# Altium footprint library ic.PcbLib: 98 footprints (part 4 of 7)
Each footprint in its own frame and in the unit in brackets; x right, y up, seen from the top. Pads: shape width x height; smd on the part's side, far side on the other; paste and mask are expansions set on the pad; w line width, h text height; cw(c..) or ccw(c..) is an arc to the next point about the centre after c.
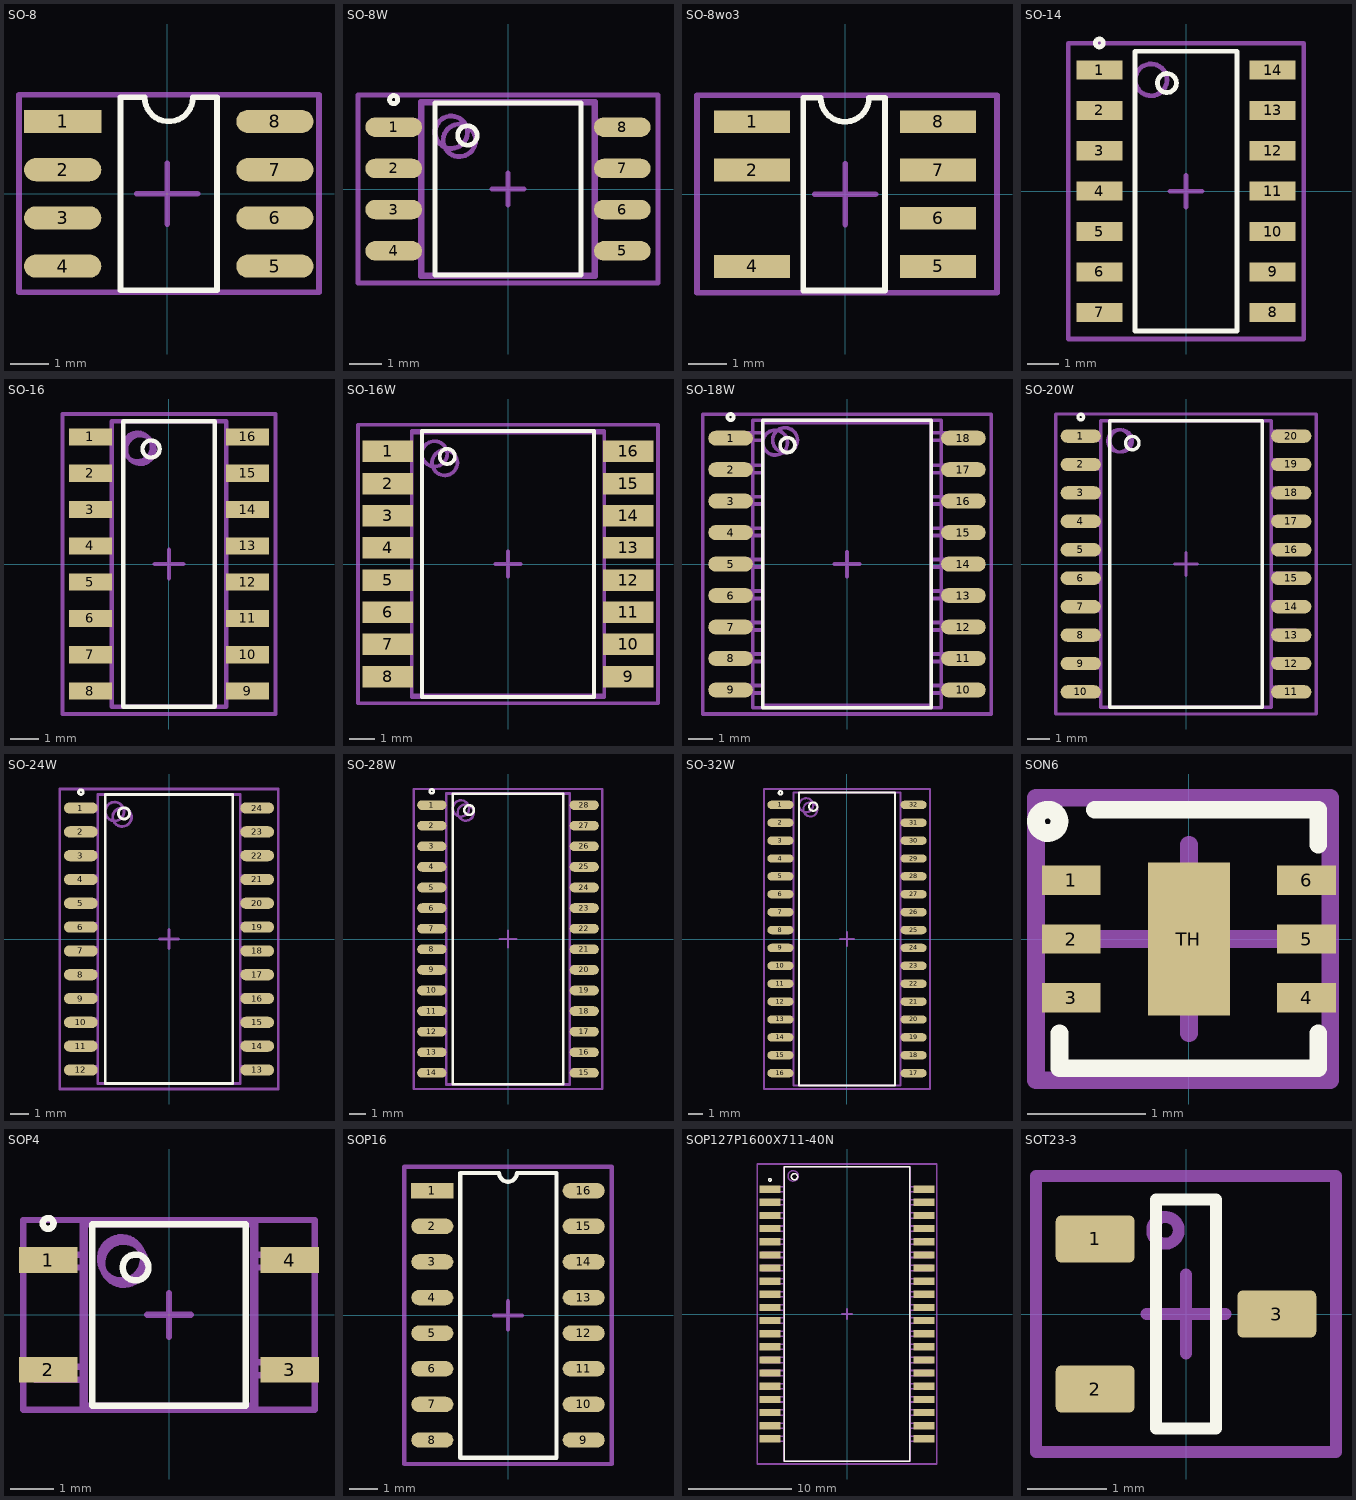
[diagram p3: the footprints below, top view; thin cyan lines are the x and y axes]

## SO-8 [mil]
pads (8):
  rect 80x24 smd: 1(-108.27,74.8)
  oval 80x24 smd: 2(-108.27,24.8) 3(-108.27,-25.2) 4(-108.27,-75.2) 5(111.73,-75.2) 6(111.73,-25.2) 7(111.73,24.8) 8(111.73,74.8)
Top Overlay:
  lines w5.91: -48.27,-100.2 -48.27,99.8 -23.27,99.8 ccw(c1.73,99.8) 26.73,99.8 51.73,99.8 51.73,-100.2 -48.27,-100.2
  text "." at -110.24,102.36 h3.94
Top Courtyard:
  lines w5.91: -31.5,0 0,0 ; 0,-31.5 0,0 ; 0,31.5 0,0 ; 31.5,0 0,0 ; -153.54,-102.36 -153.54,102.36 157.48,102.36 157.48,-102.36 -153.54,-102.36
3D body "User Library-so8-4.STEP": height 69.42, standoff 0, extent -119.06,-96.46 122.54,96.06

## SO-8W [mm] "SOIC, 8-Leads, Body 5,28x5,28mm, Pitch 1,27mm, IPC Medium Density"
height 1.91
pads (8):
  oval 1.75x0.6 smd: 1(-3.525,1.905) 2(-3.525,0.635) 3(-3.525,-0.635) 4(-3.525,-1.905) 5(3.525,-1.905) 6(3.525,-0.635) 7(3.525,0.635) 8(3.525,1.905)
Top Overlay:
  circle w0.15: c-3.525,2.755 r0.125
  circle w0.15: c-1.25,1.65 r0.3
  lines w0.15: -2.25,-2.65 -2.25,2.65 2.25,2.65 2.25,-2.65 -2.25,-2.65
Mechanical 13:
  circle w0.15: c-1.75,1.75 r0.5
  lines w0.15: -2.65,-2.65 -2.65,2.65 2.65,2.65 2.65,-2.65 -2.65,-2.65
Top Courtyard:
  lines w0.15: -0.5,0 0.5,0 ; 0,-0.5 0,0.5 ; -4.625,-2.9 -4.625,2.9 4.625,2.9 4.625,-2.9 -4.625,-2.9
Mechanical 29:
  circle w0.15: c-1.5,1.5 r0.5
  lines w0.15: -2.7,-2.1 -3.8,-2.1 -3.8,-1.8 -2.7,-1.8 ; -2.7,-0.8 -3.8,-0.8 -3.8,-0.5 -2.7,-0.5 ; -2.7,0.5 -3.8,0.5 -3.8,0.8 -2.7,0.8 ; -2.7,1.8 -3.8,1.8 -3.8,2.1 -2.7,2.1 ; 2.7,-2.1 3.8,-2.1 3.8,-1.8 2.7,-1.8 ; 2.7,-0.8 3.8,-0.8 3.8,-0.5 2.7,-0.5 ; 2.7,0.5 3.8,0.5 3.8,0.8 2.7,0.8 ; 2.7,1.8 3.8,1.8 3.8,2.1 2.7,2.1 ; -2.7,-2.7 2.7,-2.7 2.7,2.7 -2.7,2.7 -2.7,-2.7
  text ".Designator" at -2.5,-0.5 h1
3D body: height 1.91, standoff 0.1, extent -2.65,-2.65 2.65,2.65

## SO-8wo3 [mm]
pads (7):
  rect 2x0.6 smd: 1(-2.45,1.905) 2(-2.45,0.635) 4(-2.45,-1.905) 5(2.45,-1.905) 6(2.45,-0.635) 7(2.45,0.635) 8(2.45,1.905)
Top Overlay:
  lines w0.15: -1.1,-2.54 1.05,-2.54 1.05,2.54 0.629,2.54 cw(c-0.006,2.54) -0.641,2.54 -1.1,2.54 -1.1,-2.54
  text "." at -2.5,2.6 h0.1
Top Courtyard:
  lines w0.15: -0.8,0 0,0 ; 0,-0.8 0,0 ; 0,0.8 0,0 ; 0.8,0 0,0 ; -3.9,-2.6 -3.9,2.6 4,2.6 4,-2.6 -3.9,-2.6
3D body "User Library-so8-4.STEP": height 1.76, standoff 0, extent -3.099,-2.445 3.038,2.445

## SO-14 [mm] "SOIC, 14-Leads, Body 8,65x3,90mm, Pitch 1,27mm, IPC Medium Density"
height 1.75
pads (14):
  rect 1.45x0.6 smd: 1(-2.725,3.81) 2(-2.725,2.54) 3(-2.725,1.27) 4(-2.725,0) 5(-2.725,-1.27) 6(-2.725,-2.54) 7(-2.725,-3.81) 8(2.725,-3.81) 9(2.725,-2.54) 10(2.725,-1.27) 11(2.725,0) 12(2.725,1.27) 13(2.725,2.54) 14(2.725,3.81)
Top Overlay:
  circle w0.15: c-2.725,4.66 r0.125
  circle w0.15: c-0.6,3.4 r0.3
  lines w0.15: -1.6,-4.4 -1.6,4.4 1.6,4.4 1.6,-4.4 -1.6,-4.4
Mechanical 13:
  circle w0.15: c-1.1,3.5 r0.5
Top Courtyard:
  lines w0.15: -0.5,0 0.5,0 ; 0,-0.5 0,0.5 ; -3.7,-4.65 -3.7,4.65 3.7,4.65 3.7,-4.65 -3.7,-4.65
3D body "SO-14N.step": height 1.75, standoff 0, extent -3,-4.4 3,4.4

## SO-16 [mm] "SOIC, 16-Leads, Body 9,90x3,90mm, Pitch 1,27mm, IPC Medium Density"
height 1.26
pads (16):
  rect 1.5x0.6 smd: 1(-2.75,4.445) 2(-2.75,3.175) 3(-2.75,1.905) 4(-2.75,0.635) 5(-2.75,-0.635) 6(-2.75,-1.905) 7(-2.75,-3.175) 8(-2.75,-4.445) 9(2.75,-4.445) 10(2.75,-3.175) 11(2.75,-1.905) 12(2.75,-0.635) 13(2.75,0.635) 14(2.75,1.905) 15(2.75,3.175) 16(2.75,4.445)
Top Overlay:
  circle w0.15: c-0.625,4.025 r0.3
  lines w0.15: -1.6,-5 -1.6,5 1.6,5 1.6,-5 -1.6,-5
  text "." at -3.2,5.3 h0.1
Mechanical 13:
  circle w0.15: c-1.1,4.1 r0.5
  lines w0.15: -2,-5 -2,5 2,5 2,-5 -2,-5
Top Courtyard:
  lines w0.15: -0.5,0 0.5,0 ; 0,-0.5 0,0.5 ; -3.725,-5.25 -3.725,5.25 3.725,5.25 3.725,-5.25 -3.725,-5.25
Mechanical 29:
  circle w0.15: c-1,4 r0.5
  lines w0.15: -2,-4.6 -3.1,-4.6 -3.1,-4.3 -2,-4.3 ; -2,-3.33 -3.1,-3.33 -3.1,-3.03 -2,-3.03 ; -2,-2.06 -3.1,-2.06 -3.1,-1.76 -2,-1.76 ; -2,-0.79 -3.1,-0.79 -3.1,-0.49 -2,-0.49 ; -2,0.48 -3.1,0.48 -3.1,0.78 -2,0.78 ; -2,1.75 -3.1,1.75 -3.1,2.05 -2,2.05 ; -2,3.02 -3.1,3.02 -3.1,3.32 -2,3.32 ; -2,4.29 -3.1,4.29 -3.1,4.59 -2,4.59 ; 2,-4.6 3.1,-4.6 3.1,-4.3 2,-4.3 ; 2,-3.33 3.1,-3.33 3.1,-3.03 2,-3.03 ; 2,-2.06 3.1,-2.06 3.1,-1.76 2,-1.76 ; 2,-0.79 3.1,-0.79 3.1,-0.49 2,-0.49 ; 2,0.48 3.1,0.48 3.1,0.78 2,0.78 ; 2,1.75 3.1,1.75 3.1,2.05 2,2.05 ; 2,3.02 3.1,3.02 3.1,3.32 2,3.32 ; 2,4.29 3.1,4.29 3.1,4.59 2,4.59 ; -2,-5 -2,5 2,5 2,-5 -2,-5
  text ".Designator" at -1.9,-0.3 h1
3D body "SO-16.step": height 1.75, standoff 0, extent -3,-5 3,5

## SO-16W [mm] "SOIC, 16-Leads, Body 10,30x7,50mm, Pitch 1,27mm, IPC Medium Density"
height 2.65
pads (16):
  rect 2x0.85 smd: 1(-4.75,4.445) 2(-4.75,3.175) 3(-4.75,1.905) 4(-4.75,0.635) 5(-4.75,-0.635) 6(-4.75,-1.905) 7(-4.75,-3.175) 8(-4.75,-4.445) 9(4.75,-4.445) 10(4.75,-3.175) 11(4.75,-1.905) 12(4.75,-0.635) 13(4.75,0.635) 14(4.75,1.905) 15(4.75,3.175) 16(4.75,4.445)
Top Overlay:
  circle w0.15: c-2.4,4.25 r0.3
  lines w0.15: -3.4,-5.25 -3.4,5.25 3.4,5.25 3.4,-5.25 -3.4,-5.25
  text "." at -5.5,5.4 h0.1
Mechanical 13:
  circle w0.15: c-2.9,4.35 r0.5
  lines w0.15: -3.8,-5.25 -3.8,5.25 3.8,5.25 3.8,-5.25 -3.8,-5.25
Top Courtyard:
  lines w0.15: -0.5,0 0.5,0 ; 0,-0.5 0,0.5 ; -5.925,-5.5 -5.925,5.5 5.925,5.5 5.925,-5.5 -5.925,-5.5
Mechanical 29:
  circle w0.15: c-2.5,4 r0.5
  lines w0.15: -3.8,-4.7 -4.9,-4.7 -4.9,-4.4 -3.8,-4.4 ; -3.8,-3.43 -4.9,-3.43 -4.9,-3.13 -3.8,-3.13 ; -3.8,-2.16 -4.9,-2.16 -4.9,-1.86 -3.8,-1.86 ; -3.8,-0.89 -4.9,-0.89 -4.9,-0.59 -3.8,-0.59 ; -3.8,0.38 -4.9,0.38 -4.9,0.68 -3.8,0.68 ; -3.8,1.65 -4.9,1.65 -4.9,1.95 -3.8,1.95 ; -3.8,2.92 -4.9,2.92 -4.9,3.22 -3.8,3.22 ; -3.8,4.19 -4.9,4.19 -4.9,4.49 -3.8,4.49 ; 3.8,-4.7 4.9,-4.7 4.9,-4.4 3.8,-4.4 ; 3.8,-3.43 4.9,-3.43 4.9,-3.13 3.8,-3.13 ; 3.8,-2.16 4.9,-2.16 4.9,-1.86 3.8,-1.86 ; 3.8,-0.89 4.9,-0.89 4.9,-0.59 3.8,-0.59 ; 3.8,0.38 4.9,0.38 4.9,0.68 3.8,0.68 ; 3.8,1.65 4.9,1.65 4.9,1.95 3.8,1.95 ; 3.8,2.92 4.9,2.92 4.9,3.22 3.8,3.22 ; 3.8,4.19 4.9,4.19 4.9,4.49 3.8,4.49 ; -3.8,-5.2 3.8,-5.2 3.8,5.2 -3.8,5.2 -3.8,-5.2
  text ".Designator" at -3.3,-0.3 h1
3D body "SOIC16W.step": height 2.65, standoff 0, extent -5.162,-5.25 5.163,5.25

## SO-18W [mm] "JEDEC MS-013"
height 2.57
pads (18):
  oval 1.8x0.6 smd: 1(-4.7,5.08) 2(-4.7,3.81) 3(-4.7,2.54) 4(-4.7,1.27) 5(-4.7,0) 6(-4.7,-1.27) 7(-4.7,-2.54) 8(-4.7,-3.81) 9(-4.7,-5.08) 10(4.7,-5.08) 11(4.7,-3.81) 12(4.7,-2.54) 13(4.7,-1.27) 14(4.7,0) 15(4.7,1.27) 16(4.7,2.54) 17(4.7,3.81) 18(4.7,5.08)
Top Overlay:
  circle w0.15: c-4.7,5.93 r0.125
  circle w0.15: c-2.4,4.8 r0.3
  lines w0.15: -3.4,-5.8 -3.4,5.8 3.4,5.8 3.4,-5.8 -3.4,-5.8
Mechanical 13:
  circle w0.15: c-2.9,4.9 r0.5
  lines w0.15: -3.8,-5.8 -3.8,5.8 3.8,5.8 3.8,-5.8 -3.8,-5.8
Top Courtyard:
  lines w0.15: -0.5,0 0.5,0 ; 0,-0.5 0,0.5 ; -5.825,-6.05 -5.825,6.05 5.825,6.05 5.825,-6.05 -5.825,-6.05
Mechanical 29:
  circle w0.15: c-2.5,5 r0.5
  lines w0.15: -3.4,-5.2 -4.5,-5.2 -4.5,-4.9 -3.4,-4.9 ; -3.4,-3.93 -4.5,-3.93 -4.5,-3.63 -3.4,-3.63 ; -3.4,-2.66 -4.5,-2.66 -4.5,-2.36 -3.4,-2.36 ; -3.4,-1.39 -4.5,-1.39 -4.5,-1.09 -3.4,-1.09 ; -3.4,-0.12 -4.5,-0.12 -4.5,0.18 -3.4,0.18 ; -3.4,1.15 -4.5,1.15 -4.5,1.45 -3.4,1.45 ; -3.4,2.42 -4.5,2.42 -4.5,2.72 -3.4,2.72 ; -3.4,3.69 -4.5,3.69 -4.5,3.99 -3.4,3.99 ; -3.4,5 -4.5,5 -4.5,5.3 -3.4,5.3 ; 3.4,-5.2 4.5,-5.2 4.5,-4.9 3.4,-4.9 ; 3.4,-3.93 4.5,-3.93 4.5,-3.63 3.4,-3.63 ; 3.4,-2.66 4.5,-2.66 4.5,-2.36 3.4,-2.36 ; 3.4,-1.39 4.5,-1.39 4.5,-1.09 3.4,-1.09 ; 3.4,-0.12 4.5,-0.12 4.5,0.18 3.4,0.18 ; 3.4,1.15 4.5,1.15 4.5,1.45 3.4,1.45 ; 3.4,2.42 4.5,2.42 4.5,2.72 3.4,2.72 ; 3.4,3.69 4.5,3.69 4.5,3.99 3.4,3.99 ; 3.4,5 4.5,5 4.5,5.3 3.4,5.3 ; -3.4,-5.7 -3.4,5.7 3.4,5.7 3.4,-5.7 -3.4,-5.7
  text ".Designator" at -3.1,-0.4 h1
3D body: height 2.57, standoff 0.23, extent -3.8,-5.8 3.8,5.8

## SO-20W [mm] "JEDEC MS-013"
height 2.57
pads (20):
  oval 1.8x0.6 smd: 1(-4.7,5.715) 2(-4.7,4.445) 3(-4.7,3.175) 4(-4.7,1.905) 5(-4.7,0.635) 6(-4.7,-0.635) 7(-4.7,-1.905) 8(-4.7,-3.175) 9(-4.7,-4.445) 10(-4.7,-5.715) 11(4.7,-5.715) 12(4.7,-4.445) 13(4.7,-3.175) 14(4.7,-1.905) 15(4.7,-0.635) 16(4.7,0.635) 17(4.7,1.905) 18(4.7,3.175) 19(4.7,4.445) 20(4.7,5.715)
Top Overlay:
  circle w0.15: c-4.7,6.565 r0.125
  circle w0.15: c-2.4,5.4 r0.3
  lines w0.15: -3.4,-6.4 -3.4,6.4 3.4,6.4 3.4,-6.4 -3.4,-6.4
Mechanical 13:
  circle w0.15: c-2.9,5.5 r0.5
  lines w0.15: -3.8,-6.4 -3.8,6.4 3.8,6.4 3.8,-6.4 -3.8,-6.4
Top Courtyard:
  lines w0.15: -0.5,0 0.5,0 ; 0,-0.5 0,0.5 ; -5.825,-6.7 -5.825,6.7 5.825,6.7 5.825,-6.7 -5.825,-6.7
Mechanical 29:
  circle w0.15: c-3,5.5 r0.5
  lines w0.15: -3.8,-5.9 -4.9,-5.9 -4.9,-5.6 -3.8,-5.6 ; -3.8,-4.63 -4.9,-4.63 -4.9,-4.33 -3.8,-4.33 ; -3.8,-3.36 -4.9,-3.36 -4.9,-3.06 -3.8,-3.06 ; -3.8,-2.09 -4.9,-2.09 -4.9,-1.79 -3.8,-1.79 ; -3.8,-0.82 -4.9,-0.82 -4.9,-0.52 -3.8,-0.52 ; -3.8,0.45 -4.9,0.45 -4.9,0.75 -3.8,0.75 ; -3.8,1.72 -4.9,1.72 -4.9,2.02 -3.8,2.02 ; -3.8,2.99 -4.9,2.99 -4.9,3.29 -3.8,3.29 ; -3.8,4.26 -4.9,4.26 -4.9,4.56 -3.8,4.56 ; -3.8,5.53 -4.9,5.53 -4.9,5.83 -3.8,5.83 ; 3.8,-5.8 4.9,-5.8 4.9,-5.5 3.8,-5.5 ; 3.8,-4.53 4.9,-4.53 4.9,-4.23 3.8,-4.23 ; 3.8,-3.26 4.9,-3.26 4.9,-2.96 3.8,-2.96 ; 3.8,-1.99 4.9,-1.99 4.9,-1.69 3.8,-1.69 ; 3.8,-0.72 4.9,-0.72 4.9,-0.42 3.8,-0.42 ; 3.8,0.55 4.9,0.55 4.9,0.85 3.8,0.85 ; 3.8,1.82 4.9,1.82 4.9,2.12 3.8,2.12 ; 3.8,3.09 4.9,3.09 4.9,3.39 3.8,3.39 ; 3.8,4.36 4.9,4.36 4.9,4.66 3.8,4.66 ; 3.8,5.63 4.9,5.63 4.9,5.93 3.8,5.93 ; -3.8,-6.4 -3.8,6.4 3.8,6.4 3.8,-6.4 -3.8,-6.4
  text ".Designator" at -3.1,-0.3 h1
3D body: height 2.57, standoff 0.23, extent -3.8,-6.4 3.8,6.4

## SO-24W [mm] "JEDEC MS-013"
height 2.57
pads (24):
  oval 1.8x0.6 smd: 1(-4.7,6.985) 2(-4.7,5.715) 3(-4.7,4.445) 4(-4.7,3.175) 5(-4.7,1.905) 6(-4.7,0.635) 7(-4.7,-0.635) 8(-4.7,-1.905) 9(-4.7,-3.175) 10(-4.7,-4.445) 11(-4.7,-5.715) 12(-4.7,-6.985) 13(4.7,-6.985) 14(4.7,-5.715) 15(4.7,-4.445) 16(4.7,-3.175) 17(4.7,-1.905) 18(4.7,-0.635) 19(4.7,0.635) 20(4.7,1.905) 21(4.7,3.175) 22(4.7,4.445) 23(4.7,5.715) 24(4.7,6.985)
Top Overlay:
  circle w0.15: c-4.7,7.835 r0.125
  circle w0.15: c-2.4,6.7 r0.3
  lines w0.15: -3.4,-7.7 -3.4,7.7 3.4,7.7 3.4,-7.7 -3.4,-7.7
Mechanical 13:
  circle w0.15: c-2.9,6.8 r0.5
  lines w0.15: -3.8,-7.7 -3.8,7.7 3.8,7.7 3.8,-7.7 -3.8,-7.7
Top Courtyard:
  lines w0.15: -0.5,0 0.5,0 ; 0,-0.5 0,0.5 ; -5.825,-8 -5.825,8 5.825,8 5.825,-8 -5.825,-8
Mechanical 29:
  circle w0.15: c-2.5,6.5 r0.5
  lines w0.15: -3.8,-7.1 -4.9,-7.1 -4.9,-6.8 -3.8,-6.8 ; -3.8,-5.83 -4.9,-5.83 -4.9,-5.53 -3.8,-5.53 ; -3.8,-4.56 -4.9,-4.56 -4.9,-4.26 -3.8,-4.26 ; -3.8,-3.29 -4.9,-3.29 -4.9,-2.99 -3.8,-2.99 ; -3.8,-2.02 -4.9,-2.02 -4.9,-1.72 -3.8,-1.72 ; -3.8,-0.75 -4.9,-0.75 -4.9,-0.45 -3.8,-0.45 ; -3.8,0.52 -4.9,0.52 -4.9,0.82 -3.8,0.82 ; -3.8,1.79 -4.9,1.79 -4.9,2.09 -3.8,2.09 ; -3.8,3.06 -4.9,3.06 -4.9,3.36 -3.8,3.36 ; -3.8,4.33 -4.9,4.33 -4.9,4.63 -3.8,4.63 ; -3.8,5.56 -4.9,5.56 -4.9,5.86 -3.8,5.86 ; -3.8,6.83 -4.9,6.83 -4.9,7.13 -3.8,7.13 ; 3.8,-7.1 4.9,-7.1 4.9,-6.8 3.8,-6.8 ; 3.8,-5.83 4.9,-5.83 4.9,-5.53 3.8,-5.53 ; 3.8,-4.56 4.9,-4.56 4.9,-4.26 3.8,-4.26 ; 3.8,-3.29 4.9,-3.29 4.9,-2.99 3.8,-2.99 ; 3.8,-2.02 4.9,-2.02 4.9,-1.72 3.8,-1.72 ; 3.8,-0.75 4.9,-0.75 4.9,-0.45 3.8,-0.45 ; 3.8,0.52 4.9,0.52 4.9,0.82 3.8,0.82 ; 3.8,1.79 4.9,1.79 4.9,2.09 3.8,2.09 ; 3.8,3.06 4.9,3.06 4.9,3.36 3.8,3.36 ; 3.8,4.33 4.9,4.33 4.9,4.63 3.8,4.63 ; 3.8,5.56 4.9,5.56 4.9,5.86 3.8,5.86 ; 3.8,6.83 4.9,6.83 4.9,7.13 3.8,7.13 ; -3.8,-7.7 -3.8,7.7 3.8,7.7 3.8,-7.7 -3.8,-7.7
  text ".Designator" at -2.7,-0.4 h1
3D body: height 2.57, standoff 0.23, extent -3.8,-7.7 3.8,7.7

## SO-28W [mm] "JEDEC MS-013"
height 2.57
pads (28):
  oval 1.8x0.6 smd: 1(-4.7,8.255) 2(-4.7,6.985) 3(-4.7,5.715) 4(-4.7,4.445) 5(-4.7,3.175) 6(-4.7,1.905) 7(-4.7,0.635) 8(-4.7,-0.635) 9(-4.7,-1.905) 10(-4.7,-3.175) 11(-4.7,-4.445) 12(-4.7,-5.715) 13(-4.7,-6.985) 14(-4.7,-8.255) 15(4.7,-8.255) 16(4.7,-6.985) 17(4.7,-5.715) 18(4.7,-4.445) 19(4.7,-3.175) 20(4.7,-1.905) 21(4.7,-0.635) 22(4.7,0.635) 23(4.7,1.905) 24(4.7,3.175) 25(4.7,4.445) 26(4.7,5.715) 27(4.7,6.985) 28(4.7,8.255)
Top Overlay:
  circle w0.15: c-2.4,7.95 r0.3
  circle w0.15: c-4.7,9.105 r0.125
  lines w0.15: -3.4,-8.95 3.4,-8.95 3.4,8.95 -3.4,8.95 -3.4,-8.95
Mechanical 13:
  circle w0.15: c-2.9,8.05 r0.5
  lines w0.15: -3.8,-8.95 3.8,-8.95 3.8,8.95 -3.8,8.95 -3.8,-8.95
Top Courtyard:
  lines w0.15: -0.5,0 0.5,0 ; 0,-0.5 0,0.5 ; -5.825,-9.25 5.825,-9.25 5.825,9.25 -5.825,9.25 -5.825,-9.25
Mechanical 29:
  circle w0.15: c-2.6,7.8 r0.5
  lines w0.15: -3.8,-8.37 -4.9,-8.37 -4.9,-8.07 -3.8,-8.07 ; -3.8,-7.1 -4.9,-7.1 -4.9,-6.8 -3.8,-6.8 ; -3.8,-5.83 -4.9,-5.83 -4.9,-5.53 -3.8,-5.53 ; -3.8,-4.56 -4.9,-4.56 -4.9,-4.26 -3.8,-4.26 ; -3.8,-3.29 -4.9,-3.29 -4.9,-2.99 -3.8,-2.99 ; -3.8,-2.02 -4.9,-2.02 -4.9,-1.72 -3.8,-1.72 ; -3.8,-0.75 -4.9,-0.75 -4.9,-0.45 -3.8,-0.45 ; -3.8,0.52 -4.9,0.52 -4.9,0.82 -3.8,0.82 ; -3.8,1.79 -4.9,1.79 -4.9,2.09 -3.8,2.09 ; -3.8,3.06 -4.9,3.06 -4.9,3.36 -3.8,3.36 ; -3.8,4.33 -4.9,4.33 -4.9,4.63 -3.8,4.63 ; -3.8,5.56 -4.9,5.56 -4.9,5.86 -3.8,5.86 ; -3.8,6.83 -4.9,6.83 -4.9,7.13 -3.8,7.13 ; -3.8,8.1 -4.9,8.1 -4.9,8.4 -3.8,8.4 ; 3.8,-8.37 4.9,-8.37 4.9,-8.07 3.8,-8.07 ; 3.8,-7.1 4.9,-7.1 4.9,-6.8 3.8,-6.8 ; 3.8,-5.83 4.9,-5.83 4.9,-5.53 3.8,-5.53 ; 3.8,-4.56 4.9,-4.56 4.9,-4.26 3.8,-4.26 ; 3.8,-3.29 4.9,-3.29 4.9,-2.99 3.8,-2.99 ; 3.8,-2.02 4.9,-2.02 4.9,-1.72 3.8,-1.72 ; 3.8,-0.75 4.9,-0.75 4.9,-0.45 3.8,-0.45 ; 3.8,0.52 4.9,0.52 4.9,0.82 3.8,0.82 ; 3.8,1.79 4.9,1.79 4.9,2.09 3.8,2.09 ; 3.8,3.06 4.9,3.06 4.9,3.36 3.8,3.36 ; 3.8,4.33 4.9,4.33 4.9,4.63 3.8,4.63 ; 3.8,5.56 4.9,5.56 4.9,5.86 3.8,5.86 ; 3.8,6.83 4.9,6.83 4.9,7.13 3.8,7.13 ; 3.8,8.1 4.9,8.1 4.9,8.4 3.8,8.4 ; -3.8,-9 -3.8,9 3.8,9 3.8,-9 -3.8,-9
  text ".Designator" at -3.3,-0.4 h1
3D body: height 2.57, standoff 0.23, extent -3.8,-8.95 3.8,8.95

## SO-32W [mm] "JEDEC MO-119"
height 2.41
pads (32):
  oval 1.85x0.6 smd: 1(-4.725,9.525) 2(-4.725,8.255) 3(-4.725,6.985) 4(-4.725,5.715) 5(-4.725,4.445) 6(-4.725,3.175) 7(-4.725,1.905) 8(-4.725,0.635) 9(-4.725,-0.635) 10(-4.725,-1.905) 11(-4.725,-3.175) 12(-4.725,-4.445) 13(-4.725,-5.715) 14(-4.725,-6.985) 15(-4.725,-8.255) 16(-4.725,-9.525) 17(4.725,-9.525) 18(4.725,-8.255) 19(4.725,-6.985) 20(4.725,-5.715) 21(4.725,-4.445) 22(4.725,-3.175) 23(4.725,-1.905) 24(4.725,-0.635) 25(4.725,0.635) 26(4.725,1.905) 27(4.725,3.175) 28(4.725,4.445) 29(4.725,5.715) 30(4.725,6.985) 31(4.725,8.255) 32(4.725,9.525)
Top Overlay:
  circle w0.15: c-2.4,9.4 r0.3
  circle w0.15: c-4.725,10.375 r0.125
  lines w0.15: -3.4,-10.4 3.4,-10.4 3.4,10.4 -3.4,10.4 -3.4,-10.4
Mechanical 13:
  circle w0.15: c-2.9,9.5 r0.5
  lines w0.15: -3.8,-10.4 3.8,-10.4 3.8,10.4 -3.8,10.4 -3.8,-10.4
Top Courtyard:
  lines w0.15: -0.5,0 0.5,0 ; 0,-0.5 0,0.5 ; -5.9,-10.65 5.9,-10.65 5.9,10.65 -5.9,10.65 -5.9,-10.65
Mechanical 29:
  circle w0.15: c-2.6,9.2 r0.5
  lines w0.15: -3.8,-9.7 -4.9,-9.7 -4.9,-9.4 -3.8,-9.4 ; -3.8,-8.37 -4.9,-8.37 -4.9,-8.07 -3.8,-8.07 ; -3.8,-7.1 -4.9,-7.1 -4.9,-6.8 -3.8,-6.8 ; -3.8,-5.83 -4.9,-5.83 -4.9,-5.53 -3.8,-5.53 ; -3.8,-4.56 -4.9,-4.56 -4.9,-4.26 -3.8,-4.26 ; -3.8,-3.29 -4.9,-3.29 -4.9,-2.99 -3.8,-2.99 ; -3.8,-2.02 -4.9,-2.02 -4.9,-1.72 -3.8,-1.72 ; -3.8,-0.75 -4.9,-0.75 -4.9,-0.45 -3.8,-0.45 ; -3.8,0.52 -4.9,0.52 -4.9,0.82 -3.8,0.82 ; -3.8,1.79 -4.9,1.79 -4.9,2.09 -3.8,2.09 ; -3.8,3.06 -4.9,3.06 -4.9,3.36 -3.8,3.36 ; -3.8,4.33 -4.9,4.33 -4.9,4.63 -3.8,4.63 ; -3.8,5.56 -4.9,5.56 -4.9,5.86 -3.8,5.86 ; -3.8,6.83 -4.9,6.83 -4.9,7.13 -3.8,7.13 ; -3.8,8.1 -4.9,8.1 -4.9,8.4 -3.8,8.4 ; -3.8,9.4 -4.9,9.4 -4.9,9.7 -3.8,9.7 ; 3.8,-9.7 4.9,-9.7 4.9,-9.4 3.8,-9.4 ; 3.8,-8.37 4.9,-8.37 4.9,-8.07 3.8,-8.07 ; 3.8,-7.1 4.9,-7.1 4.9,-6.8 3.8,-6.8 ; 3.8,-5.83 4.9,-5.83 4.9,-5.53 3.8,-5.53 ; 3.8,-4.56 4.9,-4.56 4.9,-4.26 3.8,-4.26 ; 3.8,-3.29 4.9,-3.29 4.9,-2.99 3.8,-2.99 ; 3.8,-2.02 4.9,-2.02 4.9,-1.72 3.8,-1.72 ; 3.8,-0.75 4.9,-0.75 4.9,-0.45 3.8,-0.45 ; 3.8,0.52 4.9,0.52 4.9,0.82 3.8,0.82 ; 3.8,1.79 4.9,1.79 4.9,2.09 3.8,2.09 ; 3.8,3.06 4.9,3.06 4.9,3.36 3.8,3.36 ; 3.8,4.33 4.9,4.33 4.9,4.63 3.8,4.63 ; 3.8,5.56 4.9,5.56 4.9,5.86 3.8,5.86 ; 3.8,6.83 4.9,6.83 4.9,7.13 3.8,7.13 ; 3.8,8.1 4.9,8.1 4.9,8.4 3.8,8.4 ; 3.8,9.4 4.9,9.4 4.9,9.7 3.8,9.7 ; -3.8,-10.4 3.8,-10.4 3.8,10.4 -3.8,10.4 -3.8,-10.4
  text ".Designator" at -3.1,-0.4 h1
3D body: height 2.41, standoff 0.18, extent -3.8,-10.4 3.8,10.4

## SON6 [mm]
height 1
pads (7):
  rect 0.5x0.25 smd: 1(-1,0.5) 2(-1,0) 3(-1,-0.5) 4(1,-0.5) 5(1,0) 6(1,0.5)
  rect 0.7x1.3 smd: TH(0,0)
Top Overlay:
  circle w0.15: c-1.2,1 r0.1
  lines w0.15: -1.1,-0.8 -1.1,-1.1 1.1,-1.1 1.1,-0.8 ; -0.8,1.1 1.1,1.1 1.1,0.8
Top Courtyard:
  lines w0.15: -0.8,0 0,0 ; 0,-0.8 0,0 ; 0,0.8 0,0 ; 0.8,0 0,0 ; -1.3,-1.2 1.2,-1.2 1.2,1.2 -1.3,1.2 -1.3,-1.2
3D body: height 0.8, standoff 0, extent -1,-1 1,1

## SOP4 [mm] "SOP, 4-Leads, Body 4,00x3,79mm, Pitch 2,54mm, IPC High Density"
height 2.19
pads (4):
  rect 1.35x0.6 smd: 1(-2.8,1.27) 2(-2.8,-1.27) 3(2.8,-1.27) 4(2.8,1.27)
Top Overlay:
  circle w0.15: c-0.775,1.1 r0.3
  circle w0.15: c-2.8,2.12 r0.125
  lines w0.15: -1.775,-2.1 1.775,-2.1 1.775,2.1 -1.775,2.1 -1.775,-2.1
Mechanical 13:
  circle w0.15: c-1.05,1.2 r0.5
  lines w0.15: -1.95,-2.1 1.95,-2.1 1.95,2.1 -1.95,2.1 -1.95,-2.1
Top Courtyard:
  lines w0.15: -0.5,0 0.5,0 ; 0,-0.5 0,0.5 ; -3.375,-2.2 3.375,-2.2 3.375,2.2 -3.375,2.2 -3.375,-2.2
Mechanical 29:
  circle w0.15: c-1.1,1.3 r0.5
  lines w0.15: -2,-1.5 -3.1,-1.5 -3.1,-1.2 -2,-1.2 ; -2,1.1 -3.1,1.1 -3.1,1.4 -2,1.4 ; 2,-1.4 3.1,-1.4 3.1,-1.1 2,-1.1 ; 2,1.1 3.1,1.1 3.1,1.4 2,1.4 ; -2,-2.2 2,-2.2 2,2.2 -2,2.2 -2,-2.2
  text ".Designator" at -1.8,-0.5 h1
3D body "SOP4.step": height 2.18, standoff 0, extent -3.025,-2.1 3.025,2.1

## SOP16 [mm]
pads (16):
  rect 1.5x0.55 smd: 1(-2.7,4.445)
  oval 1.5x0.55 smd: 2(-2.7,3.175) 3(-2.7,1.905) 4(-2.7,0.635) 5(-2.7,-0.635) 6(-2.7,-1.905) 7(-2.7,-3.175) 8(-2.7,-4.445) 9(2.7,-4.445) 10(2.7,-3.175) 11(2.7,-1.905) 12(2.7,-0.635) 13(2.7,0.635) 14(2.7,1.905) 15(2.7,3.175) 16(2.7,4.445)
Top Overlay:
  lines w0.15: -1.7,-5.08 1.725,-5.08 1.725,5.08 0.318,5.08 cw(c0,5.08) -0.318,5.08 -1.7,5.08 -1.7,-5.08
  text "." at -2.7,5.145 h0.1
Top Courtyard:
  lines w0.15: -0.5,0 0.5,0 ; 0,-0.5 0,0.5 ; -3.7,-5.3 3.7,-5.3 3.7,5.3 -3.7,5.3 -3.7,-5.3
3D body "SOIC16.STEP": height 1.75, standoff 0, extent -3.1,-4.955 3.1,4.945

## SOP127P1600X711-40N [mm] "SOP, 40-Leads, Body 28,50x12,19mm, Pitch 1,27mm, IPC Medium Density"
height 7.11
pads (40):
  rect 2x0.7 smd: 1(-7.45,12.065) 2(-7.45,10.795) 3(-7.45,9.525) 4(-7.45,8.255) 5(-7.45,6.985) 6(-7.45,5.715) 7(-7.45,4.445) 8(-7.45,3.175) 9(-7.45,1.905) 10(-7.45,0.635) 11(-7.45,-0.635) 12(-7.45,-1.905) 13(-7.45,-3.175) 14(-7.45,-4.445) 15(-7.45,-5.715) 16(-7.45,-6.985) 17(-7.45,-8.255) 18(-7.45,-9.525) 19(-7.45,-10.795) 20(-7.45,-12.065) 21(7.45,-12.065) 22(7.45,-10.795) 23(7.45,-9.525) 24(7.45,-8.255) 25(7.45,-6.985) 26(7.45,-5.715) 27(7.45,-4.445) 28(7.45,-3.175) 29(7.45,-1.905) 30(7.45,-0.635) 31(7.45,0.635) 32(7.45,1.905) 33(7.45,3.175) 34(7.45,4.445) 35(7.45,5.715) 36(7.45,6.985) 37(7.45,8.255) 38(7.45,9.525) 39(7.45,10.795) 40(7.45,12.065)
Top Overlay:
  circle w0.15: c-7.45,12.965 r0.125
  circle w0.15: c-5.075,13.275 r0.3
  lines w0.15: -6.05,-14.25 -6.05,14.25 6.05,14.25 6.05,-14.25 -6.05,-14.25
Top Courtyard:
  lines w0.15: -0.5,0 0.5,0 ; 0,-0.5 0,0.5 ; -8.675,-14.5 -8.675,14.5 8.675,14.5 8.675,-14.5 -8.675,-14.5
Mechanical 29:
  circle w0.15: c-5.2,13.35 r0.5
  lines w0.15: -6.096,-12.319 -8.255,-12.319 -8.255,-11.811 -6.096,-11.811 ; -6.096,-11.049 -8.255,-11.049 -8.255,-10.541 -6.096,-10.541 ; -6.096,-9.779 -8.255,-9.779 -8.255,-9.271 -6.096,-9.271 ; -6.096,-8.509 -8.255,-8.509 -8.255,-8.001 -6.096,-8.001 ; -6.096,-7.239 -8.255,-7.239 -8.255,-6.731 -6.096,-6.731 ; -6.096,-5.969 -8.255,-5.969 -8.255,-5.461 -6.096,-5.461 ; -6.096,-4.699 -8.255,-4.699 -8.255,-4.191 -6.096,-4.191 ; -6.096,-3.429 -8.255,-3.429 -8.255,-2.921 -6.096,-2.921 ; -6.096,-2.159 -8.255,-2.159 -8.255,-1.651 -6.096,-1.651 ; -6.096,-0.889 -8.255,-0.889 -8.255,-0.381 -6.096,-0.381 ; -6.096,0.381 -8.255,0.381 -8.255,0.889 -6.096,0.889 ; -6.096,1.651 -8.255,1.651 -8.255,2.159 -6.096,2.159 ; -6.096,2.921 -8.255,2.921 -8.255,3.429 -6.096,3.429 ; -6.096,4.191 -8.255,4.191 -8.255,4.699 -6.096,4.699 ; -6.096,5.461 -8.255,5.461 -8.255,5.969 -6.096,5.969 ; -6.096,6.731 -8.255,6.731 -8.255,7.239 -6.096,7.239 ; -6.096,8.001 -8.255,8.001 -8.255,8.509 -6.096,8.509 ; -6.096,9.271 -8.255,9.271 -8.255,9.779 -6.096,9.779 ; -6.096,10.541 -8.255,10.541 -8.255,11.049 -6.096,11.049 ; -6.096,11.811 -8.255,11.811 -8.255,12.319 -6.096,12.319 ; 6.096,-12.319 8.255,-12.319 8.255,-11.811 6.096,-11.811 ; 6.096,-11.049 8.255,-11.049 8.255,-10.541 6.096,-10.541 ; 6.096,-9.779 8.255,-9.779 8.255,-9.271 6.096,-9.271 ; 6.096,-8.509 8.255,-8.509 8.255,-8.001 6.096,-8.001 ; 6.096,-7.239 8.255,-7.239 8.255,-6.731 6.096,-6.731 ; 6.096,-5.969 8.255,-5.969 8.255,-5.461 6.096,-5.461 ; 6.096,-4.699 8.255,-4.699 8.255,-4.191 6.096,-4.191 ; 6.096,-3.429 8.255,-3.429 8.255,-2.921 6.096,-2.921 ; 6.096,-2.159 8.255,-2.159 8.255,-1.651 6.096,-1.651 ; 6.096,-0.889 8.255,-0.889 8.255,-0.381 6.096,-0.381 ; 6.096,0.381 8.255,0.381 8.255,0.889 6.096,0.889 ; 6.096,1.651 8.255,1.651 8.255,2.159 6.096,2.159 ; 6.096,2.921 8.255,2.921 8.255,3.429 6.096,3.429 ; 6.096,4.191 8.255,4.191 8.255,4.699 6.096,4.699 ; 6.096,5.461 8.255,5.461 8.255,5.969 6.096,5.969 ; 6.096,6.731 8.255,6.731 8.255,7.239 6.096,7.239 ; 6.096,8.001 8.255,8.001 8.255,8.509 6.096,8.509 ; 6.096,9.271 8.255,9.271 8.255,9.779 6.096,9.779 ; 6.096,10.541 8.255,10.541 8.255,11.049 6.096,11.049 ; 6.096,11.811 8.255,11.811 8.255,12.319 6.096,12.319 ; -6.1,-14.25 -6.1,14.25 6.1,14.25 6.1,-14.25 -6.1,-14.25
  text ".Designator" at -3.2,-0.5 h1
3D body: height 7.11, standoff 0.25, extent -6.1,-14.25 6.1,14.25

## SOT23-3 [mm] "SOT23, 3 pin"
height 1.003
pads (3):
  rrect25% 1x0.6 smd: 1(-1.15,0.95) 2(-1.15,-0.95) 3(1.15,0)
Top Overlay:
  lines w0.15: -0.381,-1.45 -0.381,1.45 0.381,1.45 0.381,-1.45 -0.381,-1.45
  text "." at -2.125,0.95 h0.1
Mechanical 13:
  circle w0.15: c-0.26,1.06 r0.169
Top Courtyard:
  lines w0.15: -0.5,0 0.5,0 ; 0,-0.5 0,0.5 ; -1.9,-1.75 -1.9,1.75 1.9,1.75 1.9,-1.75 -1.9,-1.75
3D body "SOT23-3.STEP": height 1.29, standoff -0.01, extent -1.4,-1.45 1.4,1.45